# Altium footprint library CeleronLib_SMD.PcbLib: 198 footprints (part 3 of 13)
Each footprint in its own frame and in the unit in brackets; x right, y up, seen from the top. Pads: shape width x height; smd on the part's side, far side on the other; paste and mask are expansions set on the pad; w line width, h text height; cw(c..) or ccw(c..) is an arc to the next point about the centre after c.
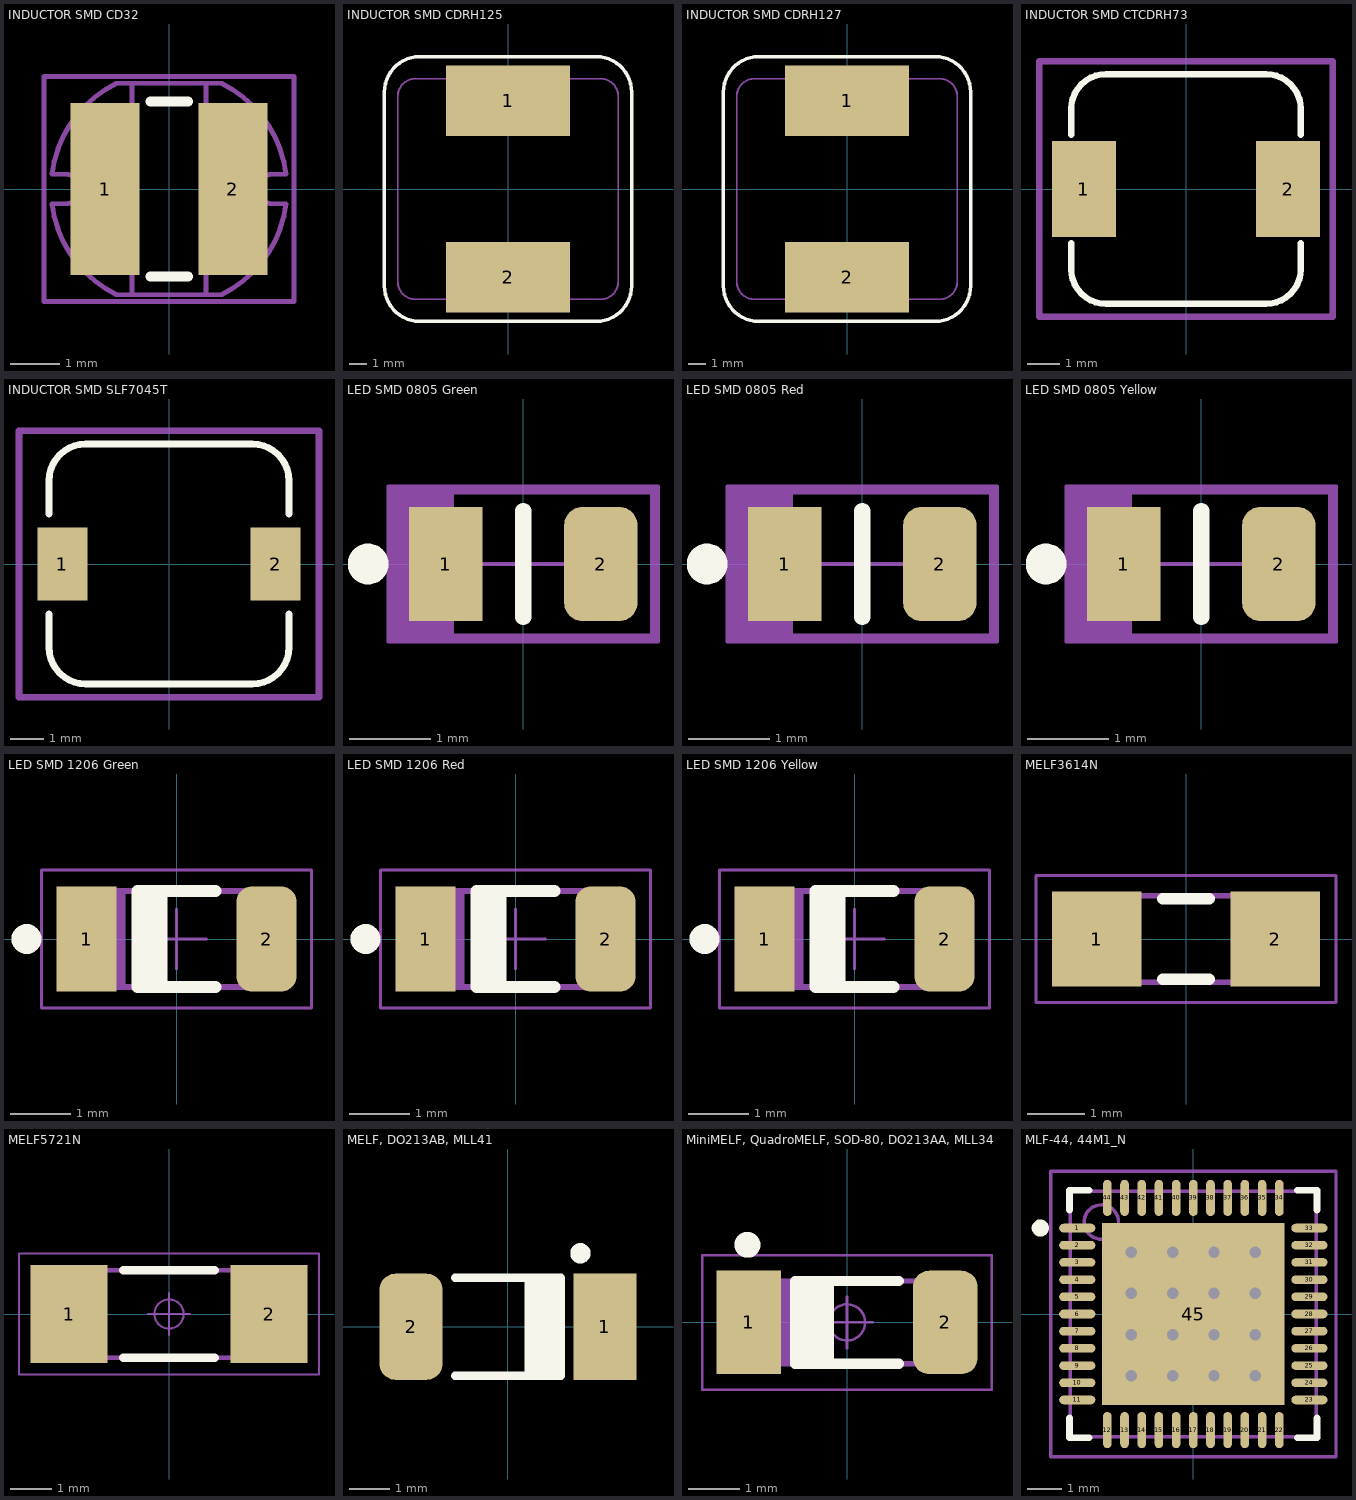
[diagram p2: the footprints below, top view; thin cyan lines are the x and y axes]

## INDUCTOR SMD CD32 [mm] "SMD Inductor  Body Width 3.5mm Body Lenght 3mm Height 2.1mm"
height 2.1
pads (2):
  rect 1.4x3.5 smd: 1(-1.3,0) 2(1.3,0)
Top Overlay:
  lines w0.2: -0.381,-1.778 0.392,-1.778 ; -0.381,1.778 0.392,1.778
Top Assy:
  lines w0.1: -0.75,-2.15 -0.75,2.15 ; 0.75,-2.15 0.75,2.15 ; -2.381,-0.3 ccw(c0,0) -1.067,-2.15 1.067,-2.15 ccw(c0,0) 2.381,-0.3 2.1,-0.3 cw(c2.1,0) 2.1,0.3 2.381,0.3 ccw(c0,0) 1.067,2.15 -1.067,2.15 ccw(c0,0) -2.381,0.3 -2.1,0.3 cw(c-2.1,0) -2.1,-0.3 -2.381,-0.3
Top Courtyard:
  lines w0.1: -2.54,-2.286 2.54,-2.286 2.54,2.286 -2.54,2.286 -2.54,-2.286
3D body: height 3.5, standoff 0, extent -2.381,-2.15 2.381,2.15

## INDUCTOR SMD CDRH125 [mm] "Индуктивность, Sumida  (12.3 x 12.3 x 6mm)"
height 6
pads (2):
  rect 7x4 smd: 1(0,5) 2(0,-5)
Top Overlay:
  lines w0.2: -7,-5.5 ccw(c-5,-5.5) -5,-7.5 5,-7.5 ccw(c5,-5.5) 7,-5.5 7,5.5 ccw(c5,5.5) 5,7.5 -5,7.5 ccw(c-5,5.5) -7,5.5 -7,-5.5
Top 3D:
  lines w0.1: -6.25,-5.25 ccw(c-5.25,-5.25) -5.25,-6.25 5.25,-6.25 ccw(c5.25,-5.25) 6.25,-5.25 6.25,5.25 ccw(c5.25,5.25) 5.25,6.25 -5.25,6.25 ccw(c-5.25,5.25) -6.25,5.25 -6.25,-5.25
3D body: height 6, standoff 0, extent -6.259,-6.259 6.259,6.259

## INDUCTOR SMD CDRH127 [mm] "Индуктивность, Sumida  (12.3 x 12.3 x 12mm)"
height 12
pads (2):
  rect 7x4 smd: 1(0,5) 2(0,-5)
Top Overlay:
  lines w0.2: -7,-5.5 ccw(c-5,-5.5) -5,-7.5 5,-7.5 ccw(c5,-5.5) 7,-5.5 7,5.5 ccw(c5,5.5) 5,7.5 -5,7.5 ccw(c-5,5.5) -7,5.5 -7,-5.5
Top 3D:
  lines w0.1: -6.25,-5.25 ccw(c-5.25,-5.25) -5.25,-6.25 5.25,-6.25 ccw(c5.25,-5.25) 6.25,-5.25 6.25,5.25 ccw(c5.25,5.25) 5.25,6.25 -5.25,6.25 ccw(c-5.25,5.25) -6.25,5.25 -6.25,-5.25
3D body: height 12, standoff 0, extent -6.259,-6.259 6.259,6.259

## INDUCTOR SMD CTCDRH73 [mm] "Индуктивность, CTCDRH73 Type, ctparts.com"
height 3.5
pads (2):
  rect 2x3 smd: 1(-3.2,0) 2(3.2,0)
Top Overlay:
  lines w0.2: -3.6,-1.7 -3.6,-2.5 ccw(c-2.5,-2.5) -2.5,-3.6 2.5,-3.6 ccw(c2.5,-2.5) 3.6,-2.5 3.6,-1.7 ; -3.6,1.7 -3.6,2.5 cw(c-2.5,2.5) -2.5,3.6 2.5,3.6 cw(c2.5,2.5) 3.6,2.5 3.6,1.7
Top Courtyard:
  lines w0.2: -4.6,-4 -4.6,4 4.6,4 4.6,-4 -4.6,-4
3D body: height 5.15, standoff 0.05, extent -3.8,-3.8 3.8,3.8

## INDUCTOR SMD SLF7045T [mm] "Индуктивность, SLF7045 Type, TDK"
height 4.8
pads (2):
  rect 1.5x2.2 smd: 1(-3.2,0) 2(3.2,0)
Top Overlay:
  lines w0.2: -3.6,-1.5 -3.6,-2.5 ccw(c-2.5,-2.5) -2.5,-3.6 2.5,-3.6 ccw(c2.5,-2.5) 3.6,-2.5 3.6,-1.5 ; -3.6,1.5 -3.6,2.5 cw(c-2.5,2.5) -2.5,3.6 2.5,3.6 cw(c2.5,2.5) 3.6,2.5 3.6,1.5
Top Courtyard:
  lines w0.2: -4.5,-4 4.5,-4 4.5,4 -4.5,4 -4.5,-4
3D body: height 4.61, standoff 0, extent -3.6,-3.5 3.6,3.5

## LED SMD 0805 Green [mm] "Green Chip LED, 2-Leads, Body 2.0x1.25mm, IPC Medium Density"
height 0.9
pads (2):
  rect 0.9x1.4 smd: 1(-0.95,0)
  rrect50% 0.9x1.4 smd: 2(0.95,0)
Top Overlay:
  circle w0.25: c-1.9,0 r0.125
  lines w0.2: 0,-0.65 0,0.65
Top Assy:
  lines w0.1: -1.5,-0.9 -1.5,0.9 ; -1.4,-0.9 -1.4,0.9 ; -1.3,-0.9 -1.3,0.9 ; -1.2,-0.9 -1.2,0.9 ; -1.1,-0.9 -1.1,0.9 ; -1,-0.9 -1,0.9 ; -0.9,-0.9 -0.9,0.9 ; -1.6,-0.9 1.6,-0.9 1.6,0.9 -1.6,0.9 -1.6,-0.9
Top Courtyard:
  lines w0.05: -0.5,0 0.5,0 ; 0,-0.5 0,0.5 ; -1.65,-0.95 1.65,-0.95 1.65,0.95 -1.65,0.95 -1.65,-0.95
3D body: height 0.9, standoff 0, extent -1.05,-0.675 1.05,0.675

## LED SMD 0805 Red [mm] "Super Red Chip LED, 2-Leads, Body 2.0x1.25mm, IPC Medium Density"
height 0.9
pads (2):
  rect 0.9x1.4 smd: 1(-0.95,0)
  rrect50% 0.9x1.4 smd: 2(0.95,0)
Top Overlay:
  circle w0.25: c-1.9,0 r0.125
  lines w0.2: 0,-0.65 0,0.65
Top Assy:
  lines w0.1: -1.5,-0.9 -1.5,0.9 ; -1.4,-0.9 -1.4,0.9 ; -1.3,-0.9 -1.3,0.9 ; -1.2,-0.9 -1.2,0.9 ; -1.1,-0.9 -1.1,0.9 ; -1,-0.9 -1,0.9 ; -0.9,-0.9 -0.9,0.9 ; -1.6,-0.9 -1.6,0.9 1.6,0.9 1.6,-0.9 -1.6,-0.9
Top Courtyard:
  lines w0.05: -0.5,0 0.5,0 ; 0,-0.5 0,0.5 ; -1.65,-0.95 -1.65,0.95 1.65,0.95 1.65,-0.95 -1.65,-0.95
3D body: height 0.9, standoff 0, extent -1.05,-0.675 1.05,0.675

## LED SMD 0805 Yellow [mm] "Yellow Chip LED, 2-Leads, Body 2.0x1.25mm, IPC Medium Density"
height 0.9
pads (2):
  rect 0.9x1.4 smd: 1(-0.95,0)
  rrect50% 0.9x1.4 smd: 2(0.95,0)
Top Overlay:
  circle w0.25: c-1.9,0 r0.125
  lines w0.2: 0,-0.65 0,0.65
Top Assy:
  lines w0.1: -1.5,-0.9 -1.5,0.9 ; -1.4,-0.9 -1.4,0.9 ; -1.3,-0.9 -1.3,0.9 ; -1.2,-0.9 -1.2,0.9 ; -1.1,-0.9 -1.1,0.9 ; -1,-0.9 -1,0.9 ; -0.9,-0.9 -0.9,0.9 ; -1.6,-0.9 1.6,-0.9 1.6,0.9 -1.6,0.9 -1.6,-0.9
Top Courtyard:
  lines w0.05: -0.5,0 0.5,0 ; 0,-0.5 0,0.5 ; -1.65,-0.95 1.65,-0.95 1.65,0.95 -1.65,0.95 -1.65,-0.95
3D body: height 0.9, standoff 0, extent -1.05,-0.675 1.05,0.675

## LED SMD 1206 Green [mm] "Green Chip LED, 2-Leads, Body 3.2 x1.6mm, IPC Medium Density"
height 1.2
pads (2):
  rect 1x1.75 smd: 1(-1.5,0)
  rrect50% 1x1.75 smd: 2(1.5,0)
Top Overlay:
  circle w0.25: c-2.5,0 r0.125
  lines w0.2: -0.45,-0.8 -0.45,0.8 ; -0.25,-0.8 -0.25,0.8 ; 0.65,-0.8 -0.65,-0.8 -0.65,0.8 0.65,0.8
Top Assy:
  lines w0.1: -1.5,-0.8 -1.5,0.8 ; -1.4,-0.8 -1.4,0.8 ; -1.3,-0.8 -1.3,0.8 ; -1.2,-0.8 -1.2,0.8 ; -1.1,-0.8 -1.1,0.8 ; -1,-0.8 -1,0.8 ; -0.9,-0.8 -0.9,0.8 ; -1.6,-0.8 -1.6,0.8 1.6,0.8 1.6,-0.8 -1.6,-0.8
Top Courtyard:
  lines w0.05: -0.5,0 0.5,0 ; 0,-0.5 0,0.5 ; -2.25,-1.15 -2.25,1.15 2.25,1.15 2.25,-1.15 -2.25,-1.15
3D body: height 1.2, standoff 0, extent -1.65,-0.85 1.65,0.85

## LED SMD 1206 Red [mm] "Red Chip LED, 2-Leads, Body 3.2 x1.6mm, IPC Medium Density"
height 1.2
pads (2):
  rect 1x1.75 smd: 1(-1.5,0)
  rrect50% 1x1.75 smd: 2(1.5,0)
Top Overlay:
  circle w0.25: c-2.5,0 r0.125
  lines w0.2: -0.45,-0.8 -0.45,0.8 ; -0.25,-0.8 -0.25,0.8 ; 0.65,-0.8 -0.65,-0.8 -0.65,0.8 0.65,0.8
Top Assy:
  lines w0.1: -1.5,-0.8 -1.5,0.8 ; -1.4,-0.8 -1.4,0.8 ; -1.3,-0.8 -1.3,0.8 ; -1.2,-0.8 -1.2,0.8 ; -1.1,-0.8 -1.1,0.8 ; -1,-0.8 -1,0.8 ; -0.9,-0.8 -0.9,0.8 ; -1.6,-0.8 1.6,-0.8 1.6,0.8 -1.6,0.8 -1.6,-0.8
Top Courtyard:
  lines w0.05: -0.5,0 0.5,0 ; 0,-0.5 0,0.5 ; -2.25,-1.15 2.25,-1.15 2.25,1.15 -2.25,1.15 -2.25,-1.15
3D body: height 1.2, standoff 0, extent -1.65,-0.85 1.65,0.85

## LED SMD 1206 Yellow [mm] "Yellow Chip LED, 2-Leads, Body 3.2 x1.6mm, IPC Medium Density"
height 1.2
pads (2):
  rect 1x1.75 smd: 1(-1.5,0)
  rrect50% 1x1.75 smd: 2(1.5,0)
Top Overlay:
  circle w0.25: c-2.5,0 r0.125
  lines w0.2: -0.45,-0.8 -0.45,0.8 ; -0.25,-0.8 -0.25,0.8 ; 0.65,-0.8 -0.65,-0.8 -0.65,0.8 0.65,0.8
Top Assy:
  lines w0.1: -1.5,-0.8 -1.5,0.8 ; -1.4,-0.8 -1.4,0.8 ; -1.3,-0.8 -1.3,0.8 ; -1.2,-0.8 -1.2,0.8 ; -1.1,-0.8 -1.1,0.8 ; -1,-0.8 -1,0.8 ; -0.9,-0.8 -0.9,0.8 ; -1.6,-0.8 -1.6,0.8 1.6,0.8 1.6,-0.8 -1.6,-0.8
Top Courtyard:
  lines w0.05: -0.5,0 0.5,0 ; 0,-0.5 0,0.5 ; -2.25,-1.15 -2.25,1.15 2.25,1.15 2.25,-1.15 -2.25,-1.15
3D body: height 1.2, standoff 0, extent -1.65,-0.85 1.65,0.85

## MELF3614N [mm] "MELF Resistor, 2-Leads, Body 3.6x1.4mm, IPC Medium Density"
height 1.5
pads (2):
  rect 1.55x1.65 smd: 1(-1.55,0) 2(1.55,0)
Top Overlay:
  lines w0.2: -0.4,-0.7 0.4,-0.7 ; -0.4,0.7 0.4,0.7
Top Assy:
  lines w0.1: -1.9,-0.75 -1.9,0.75 1.9,0.75 1.9,-0.75 -1.9,-0.75
Top Courtyard:
  lines w0.05: -2.6,-1.1 -2.6,1.1 2.6,1.1 2.6,-1.1 -2.6,-1.1
3D body: height 1.5, standoff 0, extent -1.9,-0.75 1.9,0.75

## MELF5721N [mm] "MELF Resistor, 2-Leads, Body 5.7x2.1mm, IPC Medium Density"
height 2.2
pads (2):
  rect 1.85x2.35 smd: 1(-2.4,0) 2(2.4,0)
Top Overlay:
  lines w0.2: -1.1,-1.05 1.1,-1.05 ; -1.1,1.05 1.1,1.05
Top Assy:
  lines w0.1: -2.85,-1.05 2.85,-1.05 2.85,1.05 -2.85,1.05 -2.85,-1.05
Top Courtyard:
  circle w0.05: c0,0 r0.35
  lines w0.05: -0.5,0 0.5,0 ; 0,-0.5 0,0.5 ; -3.6,-1.45 3.6,-1.45 3.6,1.45 -3.6,1.45 -3.6,-1.45
3D body: height 2.3, standoff 0.1, extent -2.9,-1.1 2.9,1.1

## MELF, DО213AB, MLL41 [mm] "Metal Electrode Face (MELF) Diode; Body 5 x 2.5 mm (LxDia)"
height 2.5
pads (2):
  rect 1.55x2.6 smd: 1(2.375,0)
  rrect50% 1.55x2.6 smd: 2(-2.375,0)
Top Overlay:
  circle w0.25: c1.775,1.8 r0.125
  lines w0.2: -1.3,-1.2 1.3,-1.2 1.3,1.2 -1.3,1.2 ; 0.51,-1.2 0.51,1.2 ; 0.71,-1.2 0.71,1.2 ; 0.91,-1.2 0.91,1.2 ; 1.11,-1.2 1.11,1.2
3D body: height 2.3, standoff 0.1, extent -2.9,-1.1 2.9,1.1

## MiniMELF, QuadroMELF, SOD-80, DО213AA, MLL34 [mm] "Размеры корпуса:  3.7 x 1.6 x 1.6 мм (146 x 63 x 63 mil)"
height 1.6
pads (2):
  rect 1.25x2 smd: 1(-1.9,0)
  rrect50% 1.25x2 smd: 2(1.9,0)
Top Overlay:
  circle w0.25: c-1.925,1.5 r0.125
  rectangle: -1,-0.8 -0.254,0.8
  lines w0.2: 1,-0.8 -1,-0.8 -1,0.8 1,0.8
Top Assy:
  rectangle: -1.85,-0.8 -0.762,0.8
  lines w0.1: -1.85,-0.8 1.85,-0.8 1.85,0.8 -1.85,0.8 -1.85,-0.8
Top Courtyard:
  circle w0.05: c0,0 r0.35
  lines w0.05: -0.5,0 0.5,0 ; 0,-0.5 0,0.5 ; -2.8,-1.3 2.8,-1.3 2.8,1.3 -2.8,1.3 -2.8,-1.3
3D body: height 1.51, standoff 0.01, extent -1.9,-0.75 1.9,0.75

## MLF-44, 44M1_N [mm] "44-Pin Quad Flat No-Lead 0.5 mm Pitch, IPC Medium Density"
height 1
pads (45):
  oval 1.05x0.25 smd: 1(-3.375,2.5) 2(-3.375,2) 3(-3.375,1.5) 4(-3.375,1) 5(-3.375,0.5) 6(-3.375,0) 7(-3.375,-0.5) 8(-3.375,-1) 9(-3.375,-1.5) 10(-3.375,-2) 11(-3.375,-2.5) 23(3.375,-2.5) 24(3.375,-2) 25(3.375,-1.5) 26(3.375,-1) 27(3.375,-0.5) 28(3.375,0) 29(3.375,0.5) 30(3.375,1) 31(3.375,1.5) 32(3.375,2) 33(3.375,2.5)
  oval 0.25x1.05 smd: 12(-2.5,-3.375) 13(-2,-3.375) 14(-1.5,-3.375) 15(-1,-3.375) 16(-0.5,-3.375) 17(0,-3.375) 18(0.5,-3.375) 19(1,-3.375) 20(1.5,-3.375) 21(2,-3.375) 22(2.5,-3.375) 34(2.5,3.375) 35(2,3.375) 36(1.5,3.375) 37(1,3.375) 38(0.5,3.375) 39(0,3.375) 40(-0.5,3.375) 41(-1,3.375) 42(-1.5,3.375) 43(-2,3.375) 44(-2.5,3.375)
  rect 5.3x5.3 smd: 45(0,0)
via -1.8,1.8 diameter 0.66 hole 0.33
via -0.6,1.8 diameter 0.66 hole 0.33
via 0.6,1.8 diameter 0.66 hole 0.33
via 1.8,1.8 diameter 0.66 hole 0.33
via -1.8,0.6 diameter 0.66 hole 0.33
via -0.6,0.6 diameter 0.66 hole 0.33
via 0.6,0.6 diameter 0.66 hole 0.33
via 1.8,0.6 diameter 0.66 hole 0.33
via -1.8,-0.6 diameter 0.66 hole 0.33
via -0.6,-0.6 diameter 0.66 hole 0.33
via 0.6,-0.6 diameter 0.66 hole 0.33
via 1.8,-0.6 diameter 0.66 hole 0.33
via -1.8,-1.8 diameter 0.66 hole 0.33
via -0.6,-1.8 diameter 0.66 hole 0.33
via 0.6,-1.8 diameter 0.66 hole 0.33
via 1.8,-1.8 diameter 0.66 hole 0.33
Top Overlay:
  circle w0.25: c-4.45,2.5 r0.125
  lines w0.2: -3.6,-3.025 -3.6,-3.6 -3.025,-3.6 ; -3.6,3.025 -3.6,3.6 -3.025,3.6 ; 3.025,-3.6 3.6,-3.6 3.6,-3.025 ; 3.025,3.6 3.6,3.6 3.6,3.025
Top Assy:
  circle w0.1: c-2.675,2.675 r0.5
  lines w0.1: -3.575,-3.575 -3.575,3.575 3.575,3.575 3.575,-3.575 -3.575,-3.575
Top Courtyard:
  lines w0.1: -0.5,0 0.5,0 ; 0,-0.5 0,0.5 ; -4.15,-4.15 -4.15,4.15 4.15,4.15 4.15,-4.15 -4.15,-4.15
3D body: height 1, standoff 0, extent -3.575,-3.575 3.575,3.575